# Altium footprint library Vowstar_Connector.PcbLib: 127 footprints (part 3 of 8)
Each footprint in its own frame and in the unit in brackets; x right, y up, seen from the top. Pads: shape width x height; smd on the part's side, far side on the other; paste and mask are expansions set on the pad; w line width, h text height; cw(c..) or ccw(c..) is an arc to the next point about the centre after c.
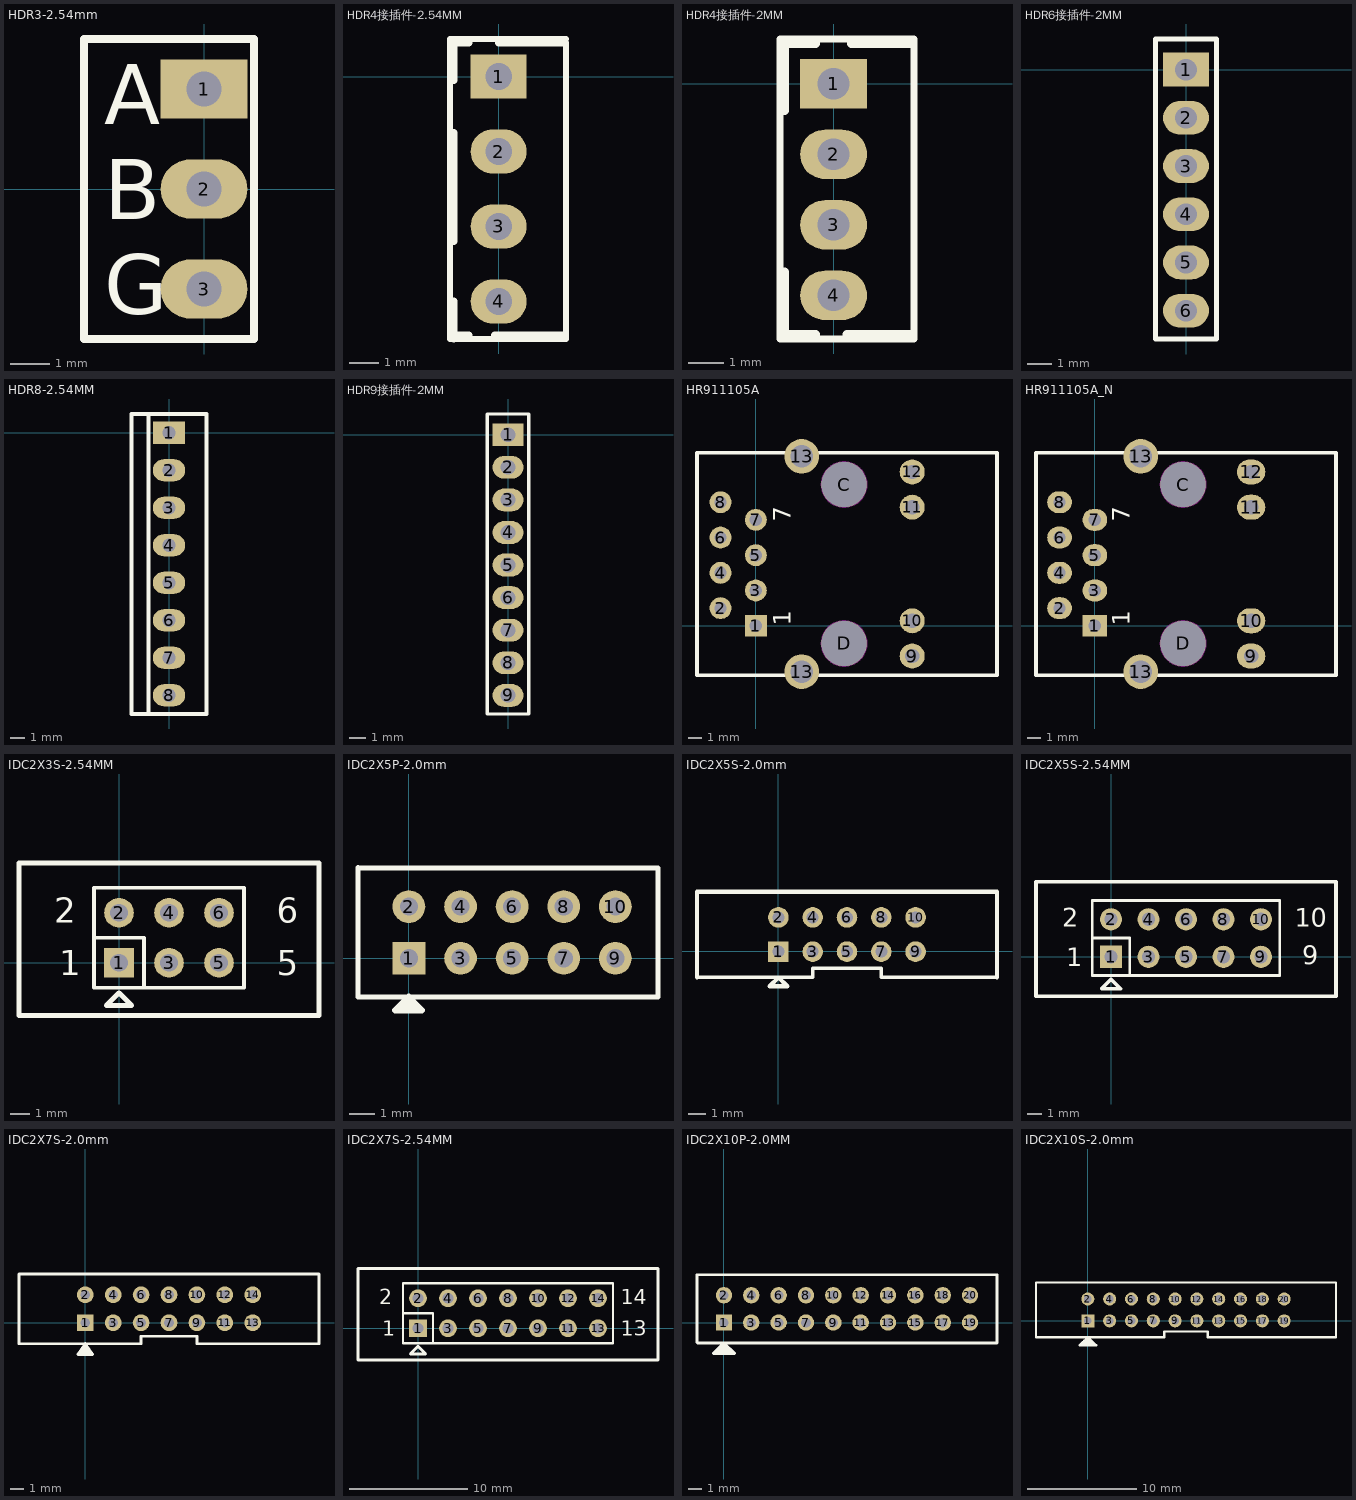
[diagram p2: the footprints below, top view; thin cyan lines are the x and y axes]

## HDR3-2.54mm [mm] "485输入"
pads (3):
  rect 2.2x1.5 hole 0.9: 1(0,2.54)
  oval 2.2x1.5 hole 0.9: 2(0,0) 3(0,-2.54)
Top Overlay:
  lines w0.2: -3.048,-3.81 1.27,-3.81 1.27,3.81 0.635,3.81 -0.635,3.81 -3.048,3.81 -3.048,-3.81
  text "G" at -2.54,-3.175 h1.52
  text "B" at -2.54,-0.762 h1.52
  text "A" at -2.54,1.651 h1.52
3D body: height 15, standoff -3, extent -0.254,2.286 0.254,2.794
3D body: height 15, standoff -3, extent -0.254,-0.254 0.254,0.254
3D body: height 15, standoff -3, extent -0.254,-2.794 0.254,-2.286

## HDR4接插件-2.54MM [mm] "HDR4接插件-2.54MM"
pads (4):
  rect 1.9x1.5 hole 0.9: 1(0,0)
  oval 1.9x1.5 hole 0.9: 2(0,-2.54) 3(0,-5.08) 4(0,-7.62)
Top Overlay:
  lines w0.2: 2.286,1.143 2.286,-8.89 -1.651,-8.89 -1.651,1.27 2.286,1.27
  lines w0.254: -1.524,-8.89 -1.524,-7.62 ; -1.524,-5.588 -1.524,-1.905 ; -1.524,-0.127 -1.524,1.143 -1.016,1.143 ; -1.397,-8.763 -1.016,-8.763 ; -0.127,-8.763 2.159,-8.763 ; 0,1.143 2.159,1.143

## HDR4接插件-2MM [mm] "HDR4接插件-2MM"
pads (4):
  rect 1.9x1.4 hole 0.9: 1(0,0)
  oval 1.9x1.4 hole 0.9: 2(0,-2) 3(0,-4) 4(0,-6.001)
Top Overlay:
  lines w0.2: -1.524,-7.239 2.286,-7.239 2.286,1.27 -1.524,1.27 -1.524,-7.239
  lines w0.254: -1.397,-5.334 -1.397,-7.112 -0.508,-7.112 ; -1.397,-0.762 -1.397,1.143 -0.508,1.143 ; 0.381,-7.112 2.159,-7.112 ; 0.508,1.143 2.159,1.143

## HDR6接插件-2MM [mm] "HDR6接插件-2MM"
pads (6):
  rect 1.9x1.4 hole 0.9: 1(0,0)
  oval 1.9x1.4 hole 0.9: 2(0,-2) 3(0,-4) 4(0,-6.001) 5(0,-8.001) 6(0,-10.001)
Top Overlay:
  lines w0.2: -1.27,-11.176 1.27,-11.176 1.27,1.27 -1.27,1.27 -1.27,-11.176

## HDR8-2.54MM [mm] "HDR8-2.54MM"
height 1.5
pads (8):
  rect 2.2x1.5 hole 0.9: 1(0,0)
  oval 2.2x1.5 hole 0.9: 2(0,-2.54) 3(0,-5.08) 4(0,-7.62) 5(0,-10.16) 6(0,-12.7) 7(0,-15.24) 8(0,-17.78)
Top Overlay:
  lines w0.254: -1.27,-19.05 2.54,-19.05 2.54,1.27 -1.27,1.27 ; -2.54,-19.05 -1.397,-19.05 -1.397,1.27 -2.54,1.27 -2.54,-19.05

## HDR9接插件-2MM [mm] "HDR9接插件-2MM"
pads (9):
  rect 1.9x1.4 hole 0.9: 1(0,0)
  oval 1.9x1.4 hole 0.9: 2(0,-2) 3(0,-4) 4(0,-6.001) 5(0,-8.001) 6(0,-10.001) 7(0,-12.002) 8(0,-14.002) 9(0,-16.002)
Top Overlay:
  lines w0.2: -1.27,-17.145 1.27,-17.145 1.27,1.27 -1.27,1.27 -1.27,-17.145

## HR911105A [mm] "HR911105A"
pads (16):
  rect 1.575x1.575 hole 0.889: 1(0,0)
  round 1.575 hole 0.889: 2(-2.54,1.27) 3(0,2.54) 4(-2.54,3.81) 5(0,5.08) 6(-2.54,6.35) 7(0,7.62) 8(-2.54,8.89)
  round 1.8 hole 1.02: 9(11.25,-2.18) 10(11.25,0.36) 11(11.25,8.53) 12(11.25,11.07)
  round 2.5 hole 1.63: 13(3.3,-3.3) 13(3.3,12.19)
  round 3.25 hole 3.25 unplated: C(6.35,10.16) D(6.35,-1.27)
Top Overlay:
  lines w0.254: -4.233,-3.555 17.35,-3.555 17.35,12.445 -4.233,12.445 -4.233,-3.555
  text "1" at 2.5,0 h1.27
  text "7" at 2.5,7.5 h1.27
Keep-Out Layer:
  circle w0.127: c6.35,10.16 r1.625
  circle w0.127: c6.35,-1.27 r1.625
3D body "User Library-HanRun-HR911105A.step": height 13.5, standoff -3, extent -4.191,-3.495 17.209,12.385

## HR911105A_N [mm] "HR911105A_N"
pads (16):
  rect 1.778x1.575 hole 0.889: 1(0,0)
  oval 1.778x1.575 hole 0.889: 2(-2.54,1.27) 3(0,2.54) 4(-2.54,3.81) 5(0,5.08) 6(-2.54,6.35) 7(0,7.62) 8(-2.54,8.89)
  oval 2.032x1.8 hole 1.02: 9(11.25,-2.18) 10(11.25,0.36) 11(11.25,8.53) 12(11.25,11.07)
  round 2.5 hole 1.63: 13(3.3,-3.3) 13(3.3,12.19)
  round 3.25 hole 3.25 unplated: C(6.35,10.16) D(6.35,-1.27)
Top Overlay:
  lines w0.254: -4.233,-3.555 17.35,-3.555 17.35,12.445 -4.233,12.445 -4.233,-3.555
  text "1" at 2.5,0 h1.27
  text "7" at 2.5,7.5 h1.27
Keep-Out Layer:
  circle w0.127: c6.35,-1.27 r1.625
  circle w0.127: c6.35,10.16 r1.625
3D body "User Library-HanRun-HR911105A.step": height 13.5, standoff -3, extent -4.191,-3.495 17.209,12.385

## IDC2X3S-2.54MM [mm] "IDC2X3-2.54MM"
pads (6):
  rect 1.5x1.5 hole 0.9: 1(0,0)
  round 1.5 hole 0.9: 2(0,2.54) 3(2.54,0) 4(2.54,2.54) 5(5.08,0) 6(5.08,2.54)
Top Overlay:
  lines w0.2: -1.27,1.27 1.27,1.27 1.27,-1.27 ; -1.27,-1.27 -1.27,3.81 6.35,3.81 6.35,-1.27 -1.27,-1.27
  lines w0.254: -0.889,-2.667 0,-2.667 ; -5.08,-2.667 10.16,-2.667 10.16,5.08 -5.08,5.08 -5.08,-2.667 ; -0.635,-2.159 0,-1.524 0.635,-2.159 -0.635,-2.159
  text "2" at -3.302,2.032 h1.27
  text "1" at -3.048,-0.635 h1.27
  text "5" at 8.001,-0.635 h1.27
  text "6" at 8.001,2.032 h1.27

## IDC2X5P-2.0mm [mm]
pads (10):
  rect 1.27x1.27 hole 0.7: 1(0,0)
  round 1.27 hole 0.7: 2(0,2) 3(2,0) 4(2,2) 5(4,0) 6(4,2) 7(6,0) 8(6,2) 9(8,0) 10(8,2)
Top Overlay:
  lines w0.2: -1.972,-1.5 9.652,-1.5 ; -1.972,-1.489 -1.972,3.511 ; -1.972,3.5 9.652,3.5 9.652,-1.444
  lines w0.254: -0.372,-1.874 0.32,-1.874 ; -0.257,-1.758 0.235,-1.758 ; -0.011,-1.489 -0.011,-1.513 ; -0.011,-1.513 0.497,-2.021 -0.519,-2.021 -0.011,-1.513

## IDC2X5S-2.0mm [mm]
pads (10):
  rect 1.2x1.2 hole 0.7: 1(0.004,-0.012)
  round 1.2 hole 0.7: 2(0.004,1.988) 3(2.004,-0.012) 4(2.004,1.988) 5(4.004,-0.012) 6(4.004,1.988) 7(6.004,-0.012) 8(6.004,1.988) 9(8.004,-0.012) 10(8.004,1.988)
Top Overlay:
  lines w0.2: -4.746,-1.512 2.004,-1.512 2.004,-0.987 6.004,-0.987 6.004,-1.512 12.754,-1.512
  lines w0.254: -4.746,-1.512 -4.746,3.488 12.754,3.488 12.754,-1.512 ; -0.498,-2.032 0.518,-2.032 0.01,-1.524 -0.498,-2.032

## IDC2X5S-2.54MM [mm] "IDC2X5-2.54MM"
pads (10):
  rect 1.5x1.5 hole 0.9: 1(0,0)
  round 1.5 hole 0.9: 2(0,2.54) 3(2.54,0) 4(2.54,2.54) 5(5.08,0) 6(5.08,2.54) 7(7.62,0) 8(7.62,2.54) 9(10.16,0) 10(10.16,2.54)
Top Overlay:
  lines w0.2: -1.27,1.27 1.27,1.27 1.27,-1.27 ; -1.27,-1.27 -1.27,3.81 11.43,3.81 11.43,-1.27 -1.27,-1.27
  lines w0.254: -0.889,-2.667 0,-2.667 ; -5.08,-2.667 15.24,-2.667 15.24,5.08 -5.08,5.08 -5.08,-2.667 ; -0.635,-2.159 0,-1.524 0.635,-2.159 -0.635,-2.159
  text "2" at -3.302,2.032 h1.27
  text "1" at -3.048,-0.635 h1.27
  text "9" at 12.954,-0.508 h1.27
  text "10" at 12.446,2.032 h1.27

## IDC2X7S-2.0mm [mm]
pads (14):
  rect 1.2x1.2 hole 0.7: 1(0,0)
  round 1.2 hole 0.7: 2(0,2) 3(2,0) 4(2,2) 5(4,0) 6(4,2) 7(6,0) 8(6,2) 9(8,0) 10(8,2) 11(10,0) 12(10,2) 13(12,0) 14(12,2)
Top Overlay:
  lines w0.2: -0.5,-2.25 0,-1.5 0.5,-2.25 ; -4.75,-1.5 4,-1.5 4,-0.975 8,-0.975 8,-1.5 16.75,-1.5 16.75,3.5 -4.75,3.5 -4.75,-1.5
  lines w0.254: -0.25,-2.25 0,-2 ; 0,-2.25 0,-1.5 ; 0.25,-2.25 0.25,-2 0,-1.75 -0.5,-2.25 0.5,-2.25

## IDC2X7S-2.54MM [mm] "IDC2X7-2.54MM"
pads (14):
  rect 1.5x1.5 hole 0.9: 1(0,0)
  round 1.5 hole 0.9: 2(0,2.54) 3(2.54,0) 4(2.54,2.54) 5(5.08,0) 6(5.08,2.54) 7(7.62,0) 8(7.62,2.54) 9(10.16,0) 10(10.16,2.54) 11(12.7,0) 12(12.7,2.54) 13(15.24,0) 14(15.24,2.54)
Top Overlay:
  lines w0.2: -1.27,1.27 1.27,1.27 1.27,-1.27 ; -1.27,-1.27 16.51,-1.27 16.51,3.81 -1.27,3.81 -1.27,-1.27
  lines w0.254: -0.889,-2.667 0,-2.667 ; -5.08,-2.667 -5.08,5.08 15.24,5.08 20.32,5.08 20.32,-2.667 -5.08,-2.667 ; -0.635,-2.159 0.635,-2.159 0,-1.524 -0.635,-2.159
  text "14" at 17.145,2.032 h1.27
  text "13" at 17.145,-0.635 h1.27
  text "1" at -3.048,-0.635 h1.27
  text "2" at -3.302,2.032 h1.27

## IDC2X10P-2.0MM [mm]
pads (20):
  rect 1.2x1.2 hole 0.7: 1(0,0)
  round 1.2 hole 0.7: 2(0,2) 3(2,0) 4(2,2) 5(4,0) 6(4,2) 7(6,0) 8(6,2) 9(8,0) 10(8,2) 11(10,0) 12(10,2) 13(12,0) 14(12,2) 15(14,0) 16(14,2) 17(16,0) 18(16,2) 19(18,0) 20(18,2)
Top Overlay:
  lines w0.2: 19.939,-1.5 -1.929,-1.5 -1.972,-1.457 -1.972,3.5 19.939,3.5 ; 19.972,-1.5 19.972,3.5
  lines w0.254: -0.5,-2 0.5,-2 ; -0.336,-1.86 0.328,-1.86 ; 0,-2.032 0,-1.524 ; 0,-1.524 0.75,-2.25 -0.75,-2.25 0,-1.524

## IDC2X10S-2.0mm [mm]
pads (20):
  rect 1.2x1.2 hole 0.7: 1(0,0)
  round 1.2 hole 0.7: 2(0,2) 3(2,0) 4(2,2) 5(4,0) 6(4,2) 7(6,0) 8(6,2) 9(8,0) 10(8,2) 11(10,0) 12(10,2) 13(12,0) 14(12,2) 15(14,0) 16(14,2) 17(16,0) 18(16,2) 19(18,0) 20(18,2)
Top Overlay:
  lines w0.2: -4.75,-1.5 -4.75,3.5 22.75,3.5 22.75,-1.5 11,-1.5 11,-0.975 7,-0.975 7,-1.5 -4.75,-1.5
  lines w0.254: -0.5,-2 0.5,-2 ; -0.336,-1.86 0.328,-1.86 ; 0,-2.032 0,-1.524 ; 0,-1.524 -0.75,-2.25 0.75,-2.25 0,-1.524